# Altium footprint library Boards.PcbLib: 6 footprints
Each footprint in its own frame and in the unit in brackets; x right, y up, seen from the top. Pads: shape width x height; smd on the part's side, far side on the other; paste and mask are expansions set on the pad; w line width, h text height; cw(c..) or ccw(c..) is an arc to the next point about the centre after c.
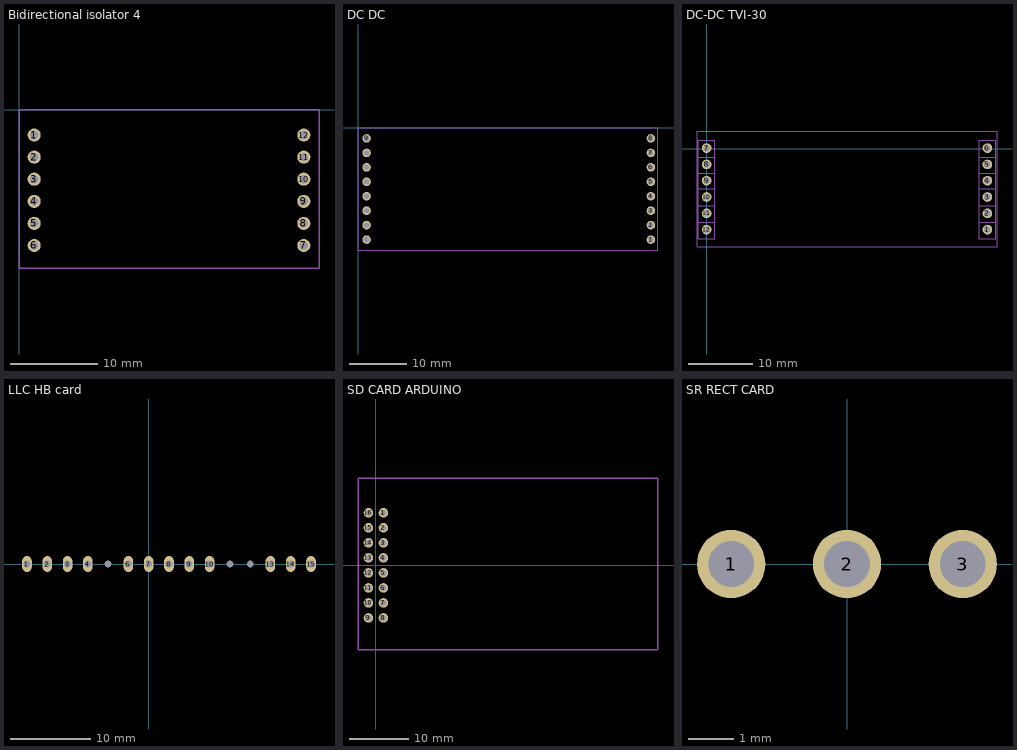
[diagram p0: the footprints below, top view; thin cyan lines are the x and y axes]

## Bidirectional isolator 4 [mm]
pads (12):
  round 1.5 hole 1: 1(1.75,-2.92) 2(1.75,-5.46) 3(1.75,-8) 4(1.75,-10.54) 5(1.75,-13.08) 6(1.75,-15.62) 7(32.75,-15.62) 8(32.75,-13.08) 9(32.75,-10.54) 10(32.75,-8) 11(32.75,-5.46) 12(32.75,-2.92)
Mechanical 13:
  lines w0.15: 0,-18.25 34.5,-18.25 34.5,0 0,0 0,-18.25
3D body "PCB1.step": height 8, standoff -3.54, extent 0,-18.5 34.5,-0.25

## DC DC [mm]
pads (16):
  round 1.5 hole 1: 1(51.5,-19.705) 2(51.5,-17.165) 3(51.5,-14.625) 4(51.5,-12.085) 5(51.5,-9.545) 6(51.5,-7.005) 7(51.5,-4.465) 8(51.5,-1.925) 9(1.5,-1.925) 10(1.5,-4.465) 11(1.5,-7.005) 12(1.5,-9.545) 13(1.5,-12.085) 14(1.5,-14.625) 15(1.5,-17.165) 16(1.5,-19.705)
Mechanical 13:
  lines w0.102: 0,-21.625 0,0 52.75,0 52.75,-21.625 26.375,-21.625 0,-21.625
3D body "DC-DC.step": height 2.5, standoff -18.91, extent 0.113,-21.5 52.887,2

## DC-DC TVI-30 [mm]
pads (12):
  round 1.5 hole 1: 1(43.754,-12.58) 2(43.754,-10.04) 3(43.754,-7.5) 4(43.754,-4.96) 5(43.754,-2.42) 6(43.754,0.12) 7(0,0.12) 8(0,-2.42) 9(0,-4.96) 10(0,-7.5) 11(0,-10.04) 12(0,-12.58)
Mechanical 13:
  lines w0.15: -1.274,-11.43 1.266,-11.43 ; -1.274,-1.27 1.266,-1.27 ; -1.27,-8.89 1.27,-8.89 ; -1.27,-6.25 1.27,-6.25 ; -1.27,-3.81 1.27,-3.81 ; 42.48,-11.43 45.02,-11.43 ; 42.48,-1.27 45.02,-1.27 ; 42.484,-8.89 45.024,-8.89 ; 42.484,-6.25 45.024,-6.25 ; 42.484,-3.81 45.024,-3.81 ; -1.5,-15.25 45.25,-15.25 45.25,2.75 -1.5,2.75 -1.5,-15.25 ; -1.274,-14 1.266,-14 1.266,1.376 -1.274,1.376 -1.274,-14 ; 42.48,-14 45.02,-14 45.02,1.376 42.48,1.376 42.48,-14
3D body "DC-DC.step": height 18.8, standoff -0.95, extent -1.5,-15.25 45.25,2.75

## LLC HB card [mm]
pads (15):
  oval 1.2x2 hole 0.85: 1(-15.24,0) 2(-12.7,0) 3(-10.16,0) 4(-7.62,0) 6(-2.54,0) 7(0,0) 8(2.54,0) 9(5.08,0) 10(7.62,0) 13(15.24,0) 14(17.78,0) 15(20.32,0)
  round 0 hole 0.85: 5(-5.08,0) 11(10.16,0) 12(12.7,0)
3D body: height 7, standoff -7.79, extent -15.24,5.08 -15.24,5.08
3D body "UCC25630 card.step": height 27, standoff -5.54, extent -16.529,-4.3 21.6,6.075

## SD CARD ARDUINO [mm]
pads (16):
  round 1.6 hole 1: 1(1.27,8.89) 2(1.27,6.35) 3(1.27,3.81) 4(1.27,1.27) 5(1.27,-1.27) 6(1.27,-3.81) 7(1.27,-6.35) 8(1.27,-8.89) 9(-1.27,-8.89) 10(-1.27,-6.35) 11(-1.27,-3.81) 12(-1.27,-1.27) 13(-1.27,1.27) 14(-1.27,3.81) 15(-1.27,6.35) 16(-1.27,8.89)
Mechanical 13:
  lines w0.25: -3.03,-14.27 -3.03,14.73 47.72,14.73 47.72,-14.27 -3.03,-14.27
3D body "User Library-ArduinoSDCardModule1.step": height 7, standoff -5.5, extent -3.073,-14.469 47.506,14.531

## SR RECT CARD [mm]
pads (3):
  round 1.5 hole 1: 1(-2.54,0) 2(0,0) 3(2.54,0)
3D body "NCP4308.step": height 31.78, standoff -4.04, extent -6.25,-4.3 7.276,6.075